# Altium footprint library LegacyRez-Axial Pot.PcbLib: 113 footprints (part 6 of 8)
Each footprint in its own frame and in the unit in brackets; x right, y up, seen from the top. Pads: shape width x height; smd on the part's side, far side on the other; paste and mask are expansions set on the pad; w line width, h text height; cw(c..) or ccw(c..) is an arc to the next point about the centre after c.
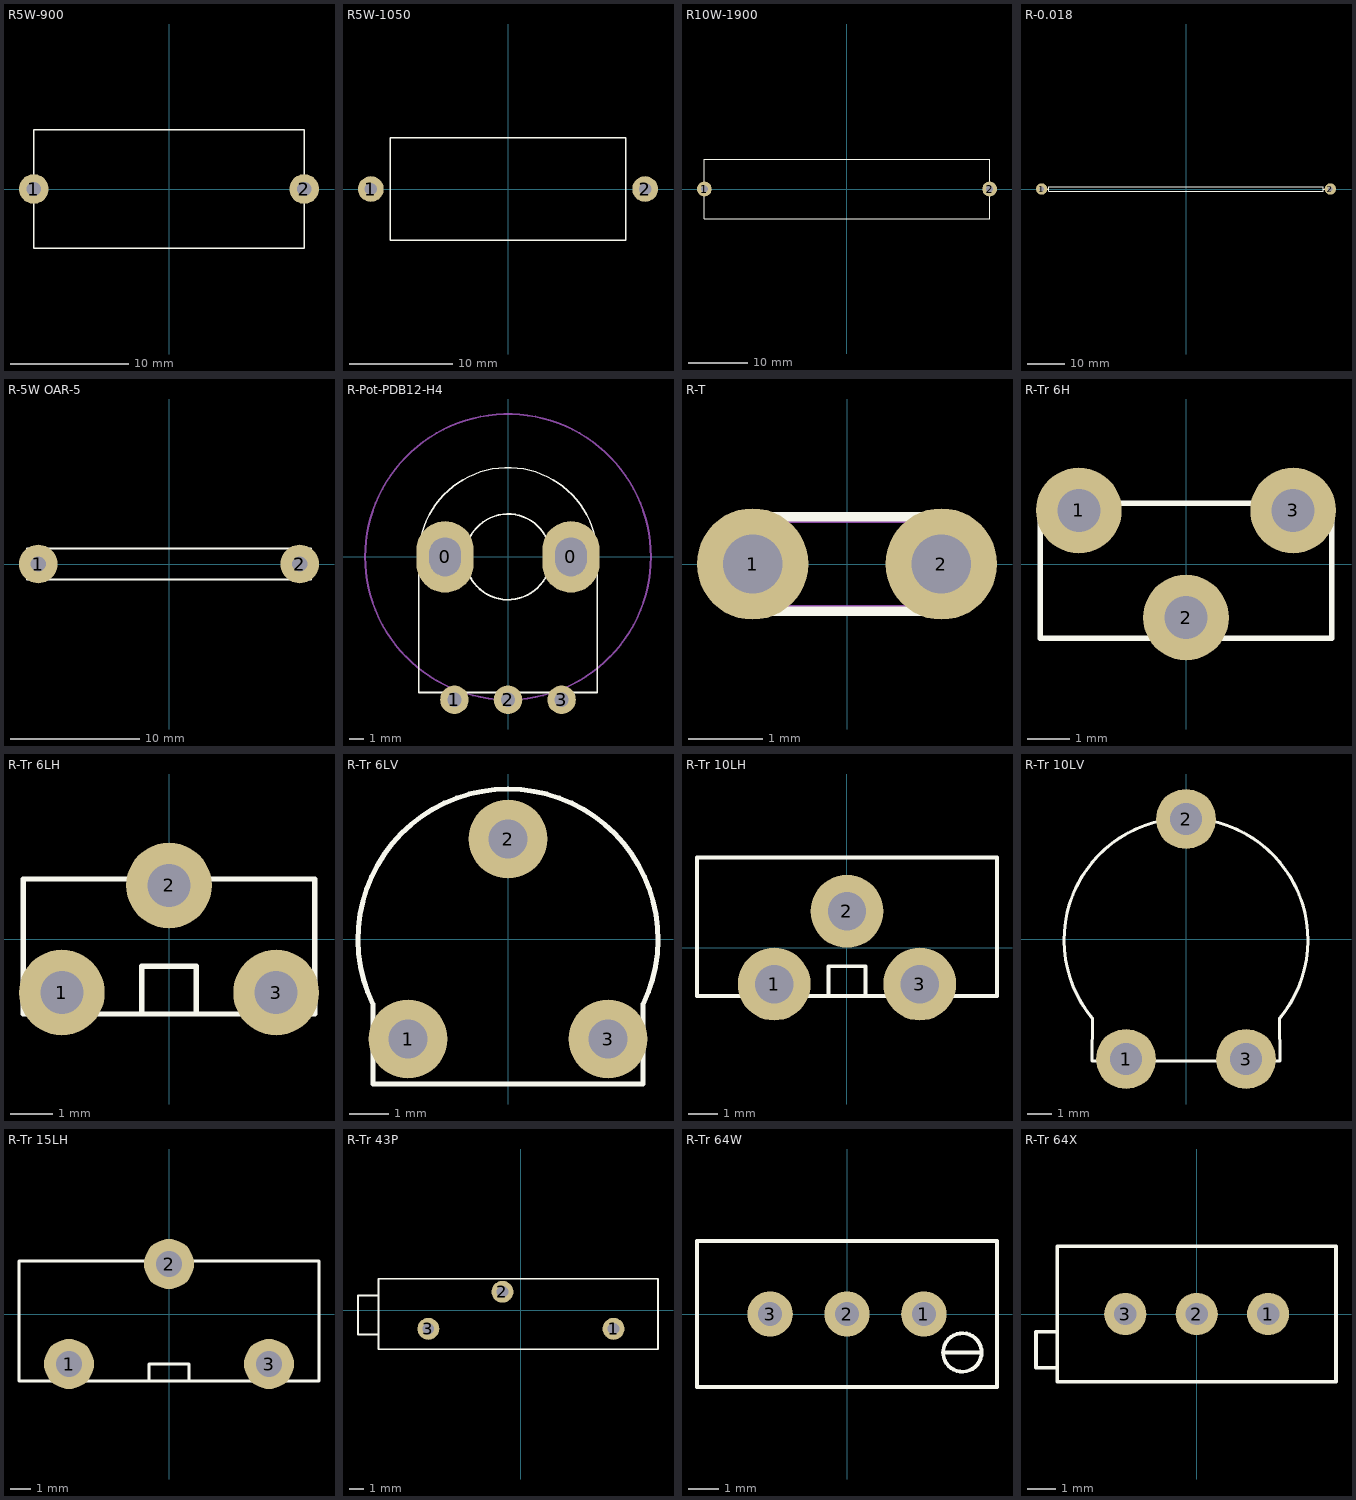
[diagram p5: the footprints below, top view; thin cyan lines are the x and y axes]

## R5W-900 [mm]
pads (2):
  round 2.5 hole 1.2: 1(-11.43,0) 2(11.43,0)
TopOverlay:
  lines w0.127: -11.43,-5 -11.43,5 11.43,5 11.43,-5 -11.43,-5
3D body "Res-(5W)-900.STEP": height 10.01, standoff -2.62, extent -11.88,-5 11.88,5

## R5W-1050 [mm]
pads (2):
  round 2.5 hole 1.2: 1(-13.335,0) 2(13.335,0)
TopOverlay:
  lines w0.127: -11.43,-5 -11.43,5 11.43,5 11.43,-5 -11.43,-5
3D body "Res-(5W)-1050.STEP": height 10.01, standoff -2.62, extent -13.785,-5 13.785,5

## R10W-1900 [mm]
pads (2):
  round 2.5 hole 1.2: 1(-24.13,0) 2(24.13,0)
TopOverlay:
  lines w0.127: -24.13,-5 24.13,-5 24.13,5 -24.13,5 -24.13,-5
3D body "Res-(10W)-1900.STEP": height 10.01, standoff -2.62, extent -24.59,-5 24.59,5

## R-0.018 [mm]
pads (2):
  round 3 hole 1.2: 1(-38.1,0) 2(38.1,0)
TopOverlay:
  lines w0.127: -38.1,0 -36.195,0 ; 36.195,0 38.1,0 ; -36.195,-0.635 -36.195,0.635 36.195,0.635 36.195,-0.635 -36.195,-0.635
3D body "R-0.018-3000.STEP": height 2.5, standoff -2.5, extent -38.6,-0.5 38.6,0.5

## R-5W OAR-5 [mm]
pads (2):
  round 3 hole 1.2: 1(-10.16,0) 2(10.16,0)
TopOverlay:
  lines w0.127: -11.06,-1.2 -11.06,1.2 11.06,1.2 11.06,-1.2 -11.06,-1.2
3D body "Res-(5W) OAR-5.STEP": height 19.77, standoff -2, extent -11.06,-1.2 11.06,1.2

## R-Pot-PDB12-H4 [mm]
pads (5):
  oval 4x5 hole 2.2 slot 2.7 at 90 deg: 0(-4.407,0) 0(4.407,0)
  round 2 hole 1: 1(-3.75,-10) 2(0,-10) 3(3.75,-10)
TopOverlay:
  circle w0.127: c0,0 r3
  lines w0.1: -6.25,0 cw(c0,0) 6.25,0
  lines w0.127: -6.25,0 -6.25,-9.5 6.25,-9.5 6.25,-1
Mechanical1:
  circle w0.127: c0,0 r10

## R-T [mm]
pads (2):
  round 1.5 hole 0.8: 1(-1.27,0) 2(1.27,0)
TopOverlay:
  lines w0.127: -1.27,-0.635 cw(c-1.27,0) -1.27,0.635 1.27,0.635 cw(c1.27,0) 1.27,-0.635 -1.27,-0.635
Mechanical13:
  lines w0.1: -1.5,-0.581 ccw(c-1.474,-0.581) -1.492,-0.6 1.493,-0.6 1.493,0.6 -1.492,0.6 ccw(c-1.474,0.582) -1.5,0.582 -1.5,-0.581
3D body "R-T d3 F2.54.STEP": height 4.5, standoff -2.29, extent -1.492,-0.6 1.493,0.6

## R-Tr 6H [mm]
pads (3):
  round 2 hole 1: 1(-2.5,1.25) 2(0,-1.25) 3(2.5,1.25)
TopOverlay:
  lines w0.127: -0.635,-1.73 -0.635,-0.635 0.635,-0.635 0.635,-1.73 ; -3.405,-1.73 3.405,-1.73 3.405,1.42 -3.405,1.42 -3.405,-1.73
3D body "PT 6 Ver.STEP": height 8.4, standoff -1.91, extent -3.405,-1.73 3.405,1.42

## R-Tr 6LH [mm]
pads (3):
  round 2 hole 1: 1(-2.5,-1.25) 2(0,1.25) 3(2.5,-1.25)
TopOverlay:
  lines w0.127: -0.635,-1.75 -0.635,-0.635 0.635,-0.635 0.635,-1.75 ; -3.405,-1.75 -3.405,1.4 3.405,1.4 3.405,-1.75 -3.405,-1.75
3D body "Rp-3306W.STEP": height 8.4, standoff -1.91, extent -3.405,-1.75 3.405,1.4

## R-Tr 6LV [mm]
pads (3):
  round 2 hole 1: 1(-2.54,-2.54) 2(0,2.54) 3(2.54,-2.54)
TopOverlay:
  lines w0.127: 3.429,-1.651 3.429,-3.683 -3.429,-3.683 -3.433,-1.653 cw(c0,0) 3.433,-1.653
3D body "Rp-3362-5.08x5.08.STEP": height 4.74, standoff -2.15, extent -3.3,-3.3 3.3,3.3

## R-Tr 10LH [mm]
pads (3):
  round 2.5 hole 1.321: 1(-2.5,-1.25) 2(0,1.25) 3(2.5,-1.25)
TopOverlay:
  lines w0.127: -0.635,-1.651 -0.635,-0.635 0.635,-0.635 0.635,-1.651 ; -5.15,-1.66 -5.15,3.1 5.15,3.1 5.15,-1.66 3.429,-1.66 -5.15,-1.66
3D body "PT10LH.STEP": height 12.1, standoff -2.5, extent -5.15,-1.66 5.15,3.1

## R-Tr 10LV [mm]
pads (3):
  round 2.5 hole 1.321: 1(-2.5,-5) 2(0,5) 3(2.5,-5)
TopOverlay:
  lines w0.127: -3.912,-5.08 3.912,-5.08 3.903,-3.303 ccw(c0,-0.051) -3.903,-3.303 -3.912,-5.08
3D body "PT10LV.step": height 6.26, standoff -2.5, extent -5.15,-5.15 5.15,5.45

## R-Tr 15LH [mm]
pads (3):
  round 2.5 hole 1.321: 1(-5,-2.5) 2(0,2.5) 3(5,-2.5)
TopOverlay:
  lines w0.127: -1,-3.35 -1,-2.5 1,-2.5 1,-3.35 ; -7.5,-3.35 7.5,-3.35 7.5,2.65 -7.5,2.65 -7.5,-3.35
3D body "Rp-PTC15 G H01-1.STEP": height 17.5, standoff -4, extent -7.5,-3.35 7.5,2.65

## R-Tr 43P [mm]
pads (3):
  round 1.5 hole 0.8: 1(6.35,-1.27) 2(-1.27,1.27) 3(-6.35,-1.27)
TopOverlay:
  lines w0.127: -9.779,-1.651 -11.176,-1.651 -11.176,1.016 -9.779,1.016 ; -9.779,-2.667 9.398,-2.667 9.398,2.159 -9.779,2.159 -9.779,-2.667
3D body "Rp-3006p-2.STEP": height 6.38, standoff -0.97, extent -11.176,-2.667 9.398,2.159

## R-Tr 64W [mm]
pads (3):
  round 1.5 hole 0.8: 1(2.54,0) 2(0,0) 3(-2.54,0)
TopOverlay:
  circle w0.127: c3.81,-1.27 r0.635
  lines w0.127: 3.175,-1.27 4.445,-1.27 ; -4.953,-2.413 4.953,-2.413 4.953,2.413 -4.953,2.413 -4.953,-2.413
3D body "Rp-3296W.STEP": height 11.55, standoff -2.5, extent -4.765,-2.421 4.765,2.41

## R-Tr 64X [mm]
pads (3):
  round 1.5 hole 0.8: 1(2.54,0) 2(0,0) 3(-2.54,0)
TopOverlay:
  lines w0.127: -4.953,-1.905 -5.715,-1.905 -5.715,-0.635 -4.953,-0.635 ; -4.953,-2.413 -4.953,2.413 4.953,2.413 4.953,-2.413 -4.953,-2.413
3D body "Rp-3296X.STEP": height 10.03, standoff -2.5, extent -6.285,-2.421 4.765,2.41